# Altium integrated library Weidmueller_OMNIMATE_Signal.IntLib: 2550 symbols (part 19 of 45)
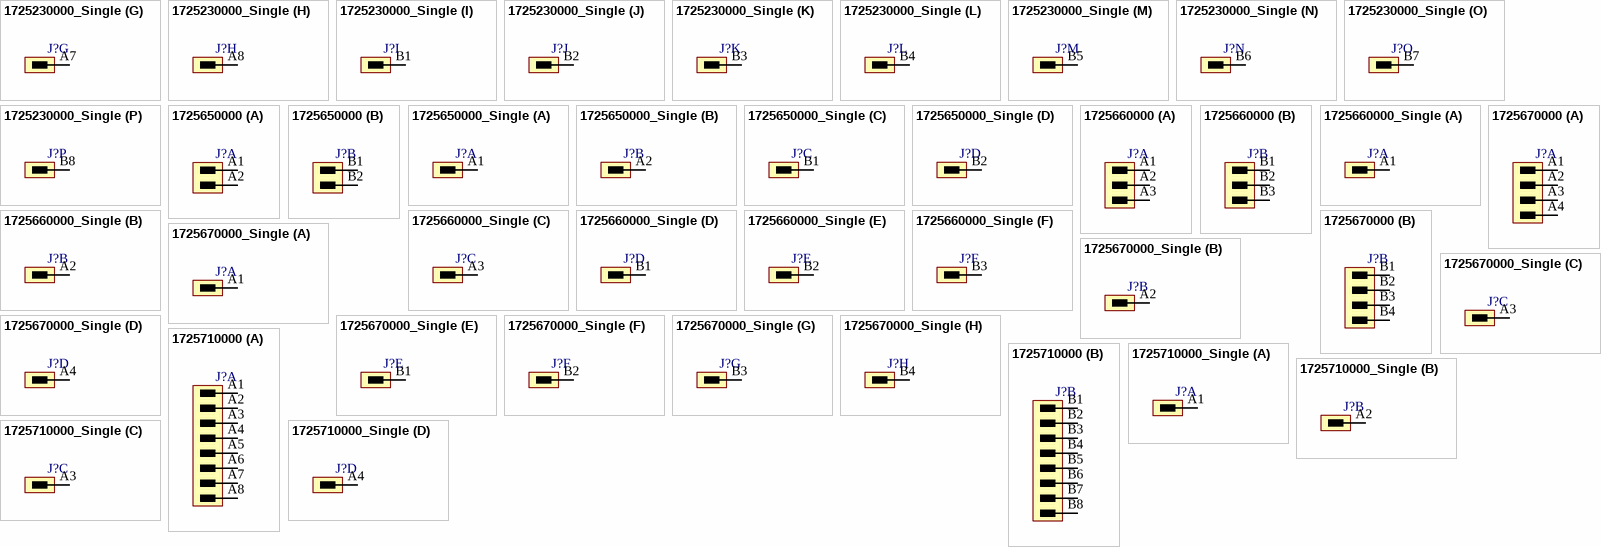
[diagram p229: symbols 1725230000_Single to 1725710000_Single]

## 1725230000_Single
designator J?
OMNIMATE Signal - series BL/SL 5.08; PartNumber: 1725230000; Manufacturer: Weidmueller; Short_text_for_material: SLD 5.08V/16/90 3.2 SN OR BX; Side_termination_characteristic: open side; Mounting_onto_the_PCB: Solder connection; Pitch_mm: 5.08 mm; Pitch_inch: 0.2 inch; No_of_poles: 16; Outgoing_elbow: 90°; Solder_pin_length_mm: 3.2 mm; Contact_material: CuSn; Contact_surface: tinned; Insulating_material: PBT; UL_94_flammability_rating: V-0; Rated_voltage_for_surge_voltage_class_pollution_degree_II_2: 400 V; Rated_voltage_use_group_B_UL_1059: 300 V; Rated_current_use_group_B_UL_1059: 10 A; PackageReference: SLDV_5_08_90_16; Colour: Orange; Packaging: Box; Qty: 20 PCS; Revision: V1; ComponentLink1Description: Manufacturer URL; ComponentLink1URL: http://www.weidmueller.com/; ComponentLink2Description: URL Link1; ComponentLink2URL: http://catalog.weidmueller.com/catalog/Start.do?localeId=en&ObjectID=1725230000
footprint SLDV_5_08_90_16 (OMNIMATE Signal - Serie BL/SL 5.08  SLD 5.08V/16/90 3.2)
part A pins: A1
part B pins: A2
part C pins: A3
part D pins: A4
part E pins: A5
part F pins: A6
part G pins: A7
part H pins: A8
part I pins: B1
part J pins: B2
part K pins: B3
part L pins: B4
part M pins: B5
part N pins: B6
part O pins: B7
part P pins: B8

## 1725650000
designator J?
OMNIMATE Signal - series BL/SL 5.08; PartNumber: 1725650000; Manufacturer: Weidmueller; Short_text_for_material: SLD 5.08V/04/180 3.2SN OR BX; Side_termination_characteristic: open side; Mounting_onto_the_PCB: Solder connection; Pitch_mm: 5.08 mm; Pitch_inch: 0.2 inch; No_of_poles: 4; Outgoing_elbow: 180°; Solder_pin_length_mm: 3.2 mm; Contact_material: CuSn; Contact_surface: tinned; Insulating_material: PBT; UL_94_flammability_rating: V-0; Rated_voltage_for_surge_voltage_class_pollution_degree_II_2: 400 V; Rated_voltage_use_group_B_UL_1059: 300 V; Rated_current_use_group_B_UL_1059: 10 A; PackageReference: SLDV_5_08_180_04; Colour: Orange; Packaging: Box; Qty: 50 PCS; Revision: V1; ComponentLink1Description: Manufacturer URL; ComponentLink1URL: http://www.weidmueller.com/; ComponentLink2Description: URL Link1; ComponentLink2URL: http://catalog.weidmueller.com/catalog/Start.do?localeId=en&ObjectID=1725650000
footprint SLDV_5_08_180_04 (OMNIMATE Signal - Serie BL/SL 5.08  SLD 5.08V/04/180 3.2)
part A pins: A1, A2
part B pins: B1, B2

## 1725650000_Single
designator J?
OMNIMATE Signal - series BL/SL 5.08; PartNumber: 1725650000; Manufacturer: Weidmueller; Short_text_for_material: SLD 5.08V/04/180 3.2SN OR BX; Side_termination_characteristic: open side; Mounting_onto_the_PCB: Solder connection; Pitch_mm: 5.08 mm; Pitch_inch: 0.2 inch; No_of_poles: 4; Outgoing_elbow: 180°; Solder_pin_length_mm: 3.2 mm; Contact_material: CuSn; Contact_surface: tinned; Insulating_material: PBT; UL_94_flammability_rating: V-0; Rated_voltage_for_surge_voltage_class_pollution_degree_II_2: 400 V; Rated_voltage_use_group_B_UL_1059: 300 V; Rated_current_use_group_B_UL_1059: 10 A; PackageReference: SLDV_5_08_180_04; Colour: Orange; Packaging: Box; Qty: 50 PCS; Revision: V1; ComponentLink1Description: Manufacturer URL; ComponentLink1URL: http://www.weidmueller.com/; ComponentLink2Description: URL Link1; ComponentLink2URL: http://catalog.weidmueller.com/catalog/Start.do?localeId=en&ObjectID=1725650000
footprint SLDV_5_08_180_04 (OMNIMATE Signal - Serie BL/SL 5.08  SLD 5.08V/04/180 3.2)
part A pins: A1
part B pins: A2
part C pins: B1
part D pins: B2

## 1725660000
designator J?
OMNIMATE Signal - series BL/SL 5.08; PartNumber: 1725660000; Manufacturer: Weidmueller; Short_text_for_material: SLD 5.08V/06/180 3.2SN OR BX; Side_termination_characteristic: open side; Mounting_onto_the_PCB: Solder connection; Pitch_mm: 5.08 mm; Pitch_inch: 0.2 inch; No_of_poles: 6; Outgoing_elbow: 180°; Solder_pin_length_mm: 3.2 mm; Contact_material: CuSn; Contact_surface: tinned; Insulating_material: PBT; UL_94_flammability_rating: V-0; Rated_voltage_for_surge_voltage_class_pollution_degree_II_2: 400 V; Rated_voltage_use_group_B_UL_1059: 300 V; Rated_current_use_group_B_UL_1059: 10 A; PackageReference: SLDV_5_08_180_06; Colour: Orange; Packaging: Box; Qty: 50 PCS; Revision: V1; ComponentLink1Description: Manufacturer URL; ComponentLink1URL: http://www.weidmueller.com/; ComponentLink2Description: URL Link1; ComponentLink2URL: http://catalog.weidmueller.com/catalog/Start.do?localeId=en&ObjectID=1725660000
footprint SLDV_5_08_180_06 (OMNIMATE Signal - Serie BL/SL 5.08  SLD 5.08V/06/180 3.2)
part A pins: A1, A2, A3
part B pins: B1, B2, B3

## 1725660000_Single
designator J?
OMNIMATE Signal - series BL/SL 5.08; PartNumber: 1725660000; Manufacturer: Weidmueller; Short_text_for_material: SLD 5.08V/06/180 3.2SN OR BX; Side_termination_characteristic: open side; Mounting_onto_the_PCB: Solder connection; Pitch_mm: 5.08 mm; Pitch_inch: 0.2 inch; No_of_poles: 6; Outgoing_elbow: 180°; Solder_pin_length_mm: 3.2 mm; Contact_material: CuSn; Contact_surface: tinned; Insulating_material: PBT; UL_94_flammability_rating: V-0; Rated_voltage_for_surge_voltage_class_pollution_degree_II_2: 400 V; Rated_voltage_use_group_B_UL_1059: 300 V; Rated_current_use_group_B_UL_1059: 10 A; PackageReference: SLDV_5_08_180_06; Colour: Orange; Packaging: Box; Qty: 50 PCS; Revision: V1; ComponentLink1Description: Manufacturer URL; ComponentLink1URL: http://www.weidmueller.com/; ComponentLink2Description: URL Link1; ComponentLink2URL: http://catalog.weidmueller.com/catalog/Start.do?localeId=en&ObjectID=1725660000
footprint SLDV_5_08_180_06 (OMNIMATE Signal - Serie BL/SL 5.08  SLD 5.08V/06/180 3.2)
part A pins: A1
part B pins: A2
part C pins: A3
part D pins: B1
part E pins: B2
part F pins: B3

## 1725670000
designator J?
OMNIMATE Signal - series BL/SL 5.08; PartNumber: 1725670000; Manufacturer: Weidmueller; Short_text_for_material: SLD 5.08V/08/180 3.2SN OR BX; Side_termination_characteristic: open side; Mounting_onto_the_PCB: Solder connection; Pitch_mm: 5.08 mm; Pitch_inch: 0.2 inch; No_of_poles: 8; Outgoing_elbow: 180°; Solder_pin_length_mm: 3.2 mm; Contact_material: CuSn; Contact_surface: tinned; Insulating_material: PBT; UL_94_flammability_rating: V-0; Rated_voltage_for_surge_voltage_class_pollution_degree_II_2: 400 V; Rated_voltage_use_group_B_UL_1059: 300 V; Rated_current_use_group_B_UL_1059: 10 A; PackageReference: SLDV_5_08_180_08; Colour: Orange; Packaging: Box; Qty: 50 PCS; Revision: V1; ComponentLink1Description: Manufacturer URL; ComponentLink1URL: http://www.weidmueller.com/; ComponentLink2Description: URL Link1; ComponentLink2URL: http://catalog.weidmueller.com/catalog/Start.do?localeId=en&ObjectID=1725670000
footprint SLDV_5_08_180_08 (OMNIMATE Signal - Serie BL/SL 5.08  SLD 5.08V/08/180 3.2)
part A pins: A1, A2, A3, A4
part B pins: B1, B2, B3, B4

## 1725670000_Single
designator J?
OMNIMATE Signal - series BL/SL 5.08; PartNumber: 1725670000; Manufacturer: Weidmueller; Short_text_for_material: SLD 5.08V/08/180 3.2SN OR BX; Side_termination_characteristic: open side; Mounting_onto_the_PCB: Solder connection; Pitch_mm: 5.08 mm; Pitch_inch: 0.2 inch; No_of_poles: 8; Outgoing_elbow: 180°; Solder_pin_length_mm: 3.2 mm; Contact_material: CuSn; Contact_surface: tinned; Insulating_material: PBT; UL_94_flammability_rating: V-0; Rated_voltage_for_surge_voltage_class_pollution_degree_II_2: 400 V; Rated_voltage_use_group_B_UL_1059: 300 V; Rated_current_use_group_B_UL_1059: 10 A; PackageReference: SLDV_5_08_180_08; Colour: Orange; Packaging: Box; Qty: 50 PCS; Revision: V1; ComponentLink1Description: Manufacturer URL; ComponentLink1URL: http://www.weidmueller.com/; ComponentLink2Description: URL Link1; ComponentLink2URL: http://catalog.weidmueller.com/catalog/Start.do?localeId=en&ObjectID=1725670000
footprint SLDV_5_08_180_08 (OMNIMATE Signal - Serie BL/SL 5.08  SLD 5.08V/08/180 3.2)
part A pins: A1
part B pins: A2
part C pins: A3
part D pins: A4
part E pins: B1
part F pins: B2
part G pins: B3
part H pins: B4

## 1725710000
designator J?
OMNIMATE Signal - series BL/SL 5.08; PartNumber: 1725710000; Manufacturer: Weidmueller; Short_text_for_material: SLD 5.08V/16/180 3.2SN OR BX; Side_termination_characteristic: open side; Mounting_onto_the_PCB: Solder connection; Pitch_mm: 5.08 mm; Pitch_inch: 0.2 inch; No_of_poles: 16; Outgoing_elbow: 180°; Solder_pin_length_mm: 3.2 mm; Contact_material: CuSn; Contact_surface: tinned; Insulating_material: PBT; UL_94_flammability_rating: V-0; Rated_voltage_for_surge_voltage_class_pollution_degree_II_2: 400 V; Rated_voltage_use_group_B_UL_1059: 300 V; Rated_current_use_group_B_UL_1059: 10 A; PackageReference: SLDV_5_08_180_16; Colour: Orange; Packaging: Box; Qty: 20 PCS; Revision: V1; ComponentLink1Description: Manufacturer URL; ComponentLink1URL: http://www.weidmueller.com/; ComponentLink2Description: URL Link1; ComponentLink2URL: http://catalog.weidmueller.com/catalog/Start.do?localeId=en&ObjectID=1725710000
footprint SLDV_5_08_180_16 (OMNIMATE Signal - Serie BL/SL 5.08  SLD 5.08V/16/180 3.2)
part A pins: A1, A2, A3, A4, A5, A6, A7, A8
part B pins: B1, B2, B3, B4, B5, B6, B7, B8

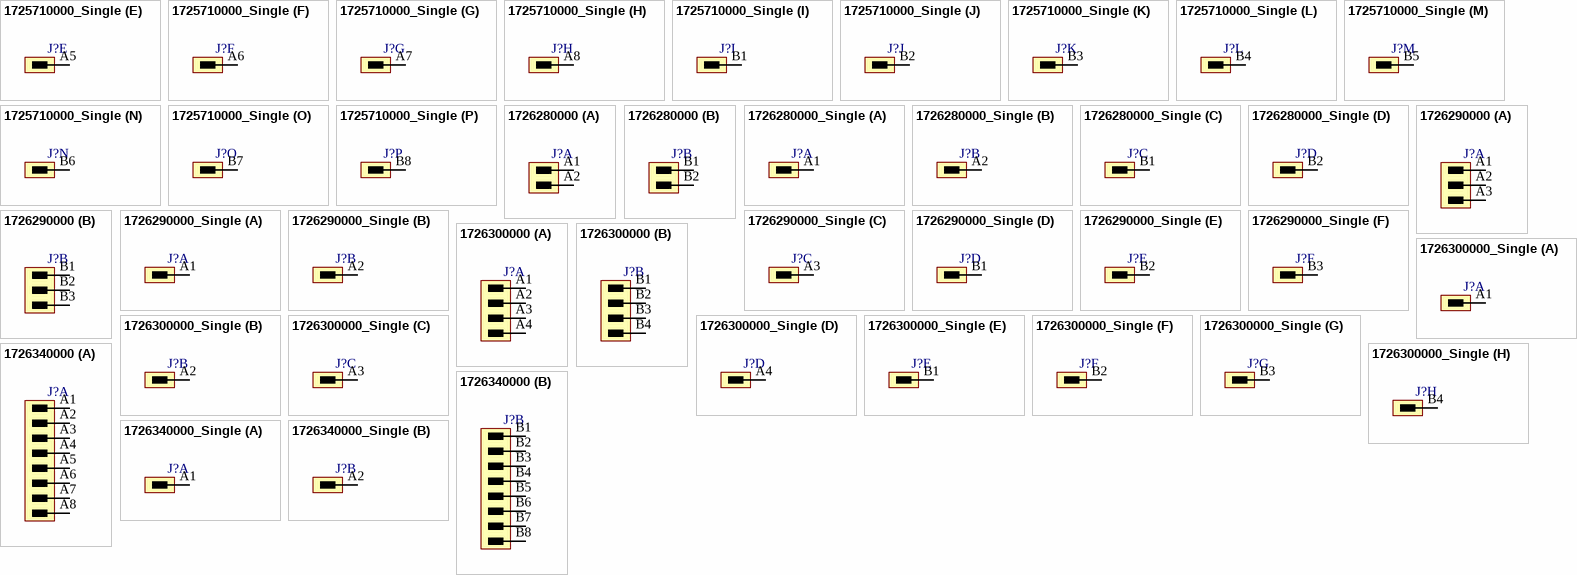
[diagram p102: symbols 1725710000_Single to 1726340000_Single]

## 1725710000_Single
designator J?
OMNIMATE Signal - series BL/SL 5.08; PartNumber: 1725710000; Manufacturer: Weidmueller; Short_text_for_material: SLD 5.08V/16/180 3.2SN OR BX; Side_termination_characteristic: open side; Mounting_onto_the_PCB: Solder connection; Pitch_mm: 5.08 mm; Pitch_inch: 0.2 inch; No_of_poles: 16; Outgoing_elbow: 180°; Solder_pin_length_mm: 3.2 mm; Contact_material: CuSn; Contact_surface: tinned; Insulating_material: PBT; UL_94_flammability_rating: V-0; Rated_voltage_for_surge_voltage_class_pollution_degree_II_2: 400 V; Rated_voltage_use_group_B_UL_1059: 300 V; Rated_current_use_group_B_UL_1059: 10 A; PackageReference: SLDV_5_08_180_16; Colour: Orange; Packaging: Box; Qty: 20 PCS; Revision: V1; ComponentLink1Description: Manufacturer URL; ComponentLink1URL: http://www.weidmueller.com/; ComponentLink2Description: URL Link1; ComponentLink2URL: http://catalog.weidmueller.com/catalog/Start.do?localeId=en&ObjectID=1725710000
footprint SLDV_5_08_180_16 (OMNIMATE Signal - Serie BL/SL 5.08  SLD 5.08V/16/180 3.2)
part A pins: A1
part B pins: A2
part C pins: A3
part D pins: A4
part E pins: A5
part F pins: A6
part G pins: A7
part H pins: A8
part I pins: B1
part J pins: B2
part K pins: B3
part L pins: B4
part M pins: B5
part N pins: B6
part O pins: B7
part P pins: B8

## 1726280000
designator J?
OMNIMATE Signal - series BL/SL 5.08; PartNumber: 1726280000; Manufacturer: Weidmueller; Short_text_for_material: SLD 5.08V/04/90B 3.2 SN OR BX; Side_termination_characteristic: Dovetails for fixing blocks; Mounting_onto_the_PCB: Solder connection; Pitch_mm: 5.08 mm; Pitch_inch: 0.2 inch; No_of_poles: 4; Outgoing_elbow: 90°; Solder_pin_length_mm: 3.2 mm; Contact_material: CuSn; Contact_surface: tinned; Insulating_material: PBT; UL_94_flammability_rating: V-0; Rated_voltage_for_surge_voltage_class_pollution_degree_II_2: 400 V; Rated_voltage_use_group_B_UL_1059: 300 V; Rated_current_use_group_B_UL_1059: 10 A; PackageReference: SLDV_5_08_90B_04; Colour: Orange; Packaging: Box; Qty: 50 PCS; Revision: V1; ComponentLink1Description: Manufacturer URL; ComponentLink1URL: http://www.weidmueller.com/; ComponentLink2Description: URL Link1; ComponentLink2URL: http://catalog.weidmueller.com/catalog/Start.do?localeId=en&ObjectID=1726280000
footprint SLDV_5_08_90B_04 (OMNIMATE Signal - Serie BL/SL 5.08  SLD 5.08V/04/90B 3.2)
part A pins: A1, A2
part B pins: B1, B2

## 1726280000_Single
designator J?
OMNIMATE Signal - series BL/SL 5.08; PartNumber: 1726280000; Manufacturer: Weidmueller; Short_text_for_material: SLD 5.08V/04/90B 3.2 SN OR BX; Side_termination_characteristic: Dovetails for fixing blocks; Mounting_onto_the_PCB: Solder connection; Pitch_mm: 5.08 mm; Pitch_inch: 0.2 inch; No_of_poles: 4; Outgoing_elbow: 90°; Solder_pin_length_mm: 3.2 mm; Contact_material: CuSn; Contact_surface: tinned; Insulating_material: PBT; UL_94_flammability_rating: V-0; Rated_voltage_for_surge_voltage_class_pollution_degree_II_2: 400 V; Rated_voltage_use_group_B_UL_1059: 300 V; Rated_current_use_group_B_UL_1059: 10 A; PackageReference: SLDV_5_08_90B_04; Colour: Orange; Packaging: Box; Qty: 50 PCS; Revision: V1; ComponentLink1Description: Manufacturer URL; ComponentLink1URL: http://www.weidmueller.com/; ComponentLink2Description: URL Link1; ComponentLink2URL: http://catalog.weidmueller.com/catalog/Start.do?localeId=en&ObjectID=1726280000
footprint SLDV_5_08_90B_04 (OMNIMATE Signal - Serie BL/SL 5.08  SLD 5.08V/04/90B 3.2)
part A pins: A1
part B pins: A2
part C pins: B1
part D pins: B2

## 1726290000
designator J?
OMNIMATE Signal - series BL/SL 5.08; PartNumber: 1726290000; Manufacturer: Weidmueller; Short_text_for_material: SLD 5.08V/06/90B 3.2 SN OR BX; Side_termination_characteristic: Dovetails for fixing blocks; Mounting_onto_the_PCB: Solder connection; Pitch_mm: 5.08 mm; Pitch_inch: 0.2 inch; No_of_poles: 6; Outgoing_elbow: 90°; Solder_pin_length_mm: 3.2 mm; Contact_material: CuSn; Contact_surface: tinned; Insulating_material: PBT; UL_94_flammability_rating: V-0; Rated_voltage_for_surge_voltage_class_pollution_degree_II_2: 400 V; Rated_voltage_use_group_B_UL_1059: 300 V; Rated_current_use_group_B_UL_1059: 10 A; PackageReference: SLDV_5_08_90B_06; Colour: Orange; Packaging: Box; Qty: 50 PCS; Revision: V1; ComponentLink1Description: Manufacturer URL; ComponentLink1URL: http://www.weidmueller.com/; ComponentLink2Description: URL Link1; ComponentLink2URL: http://catalog.weidmueller.com/catalog/Start.do?localeId=en&ObjectID=1726290000
footprint SLDV_5_08_90B_06 (OMNIMATE Signal - Serie BL/SL 5.08  SLD 5.08V/06/90B 3.2)
part A pins: A1, A2, A3
part B pins: B1, B2, B3

## 1726290000_Single
designator J?
OMNIMATE Signal - series BL/SL 5.08; PartNumber: 1726290000; Manufacturer: Weidmueller; Short_text_for_material: SLD 5.08V/06/90B 3.2 SN OR BX; Side_termination_characteristic: Dovetails for fixing blocks; Mounting_onto_the_PCB: Solder connection; Pitch_mm: 5.08 mm; Pitch_inch: 0.2 inch; No_of_poles: 6; Outgoing_elbow: 90°; Solder_pin_length_mm: 3.2 mm; Contact_material: CuSn; Contact_surface: tinned; Insulating_material: PBT; UL_94_flammability_rating: V-0; Rated_voltage_for_surge_voltage_class_pollution_degree_II_2: 400 V; Rated_voltage_use_group_B_UL_1059: 300 V; Rated_current_use_group_B_UL_1059: 10 A; PackageReference: SLDV_5_08_90B_06; Colour: Orange; Packaging: Box; Qty: 50 PCS; Revision: V1; ComponentLink1Description: Manufacturer URL; ComponentLink1URL: http://www.weidmueller.com/; ComponentLink2Description: URL Link1; ComponentLink2URL: http://catalog.weidmueller.com/catalog/Start.do?localeId=en&ObjectID=1726290000
footprint SLDV_5_08_90B_06 (OMNIMATE Signal - Serie BL/SL 5.08  SLD 5.08V/06/90B 3.2)
part A pins: A1
part B pins: A2
part C pins: A3
part D pins: B1
part E pins: B2
part F pins: B3

## 1726300000
designator J?
OMNIMATE Signal - series BL/SL 5.08; PartNumber: 1726300000; Manufacturer: Weidmueller; Short_text_for_material: SLD 5.08V/08/90B 3.2 SN OR BX; Side_termination_characteristic: Dovetails for fixing blocks; Mounting_onto_the_PCB: Solder connection; Pitch_mm: 5.08 mm; Pitch_inch: 0.2 inch; No_of_poles: 8; Outgoing_elbow: 90°; Solder_pin_length_mm: 3.2 mm; Contact_material: CuSn; Contact_surface: tinned; Insulating_material: PBT; UL_94_flammability_rating: V-0; Rated_voltage_for_surge_voltage_class_pollution_degree_II_2: 400 V; Rated_voltage_use_group_B_UL_1059: 300 V; Rated_current_use_group_B_UL_1059: 10 A; PackageReference: SLDV_5_08_90B_08; Colour: Orange; Packaging: Box; Qty: 50 PCS; Revision: V1; ComponentLink1Description: Manufacturer URL; ComponentLink1URL: http://www.weidmueller.com/; ComponentLink2Description: URL Link1; ComponentLink2URL: http://catalog.weidmueller.com/catalog/Start.do?localeId=en&ObjectID=1726300000
footprint SLDV_5_08_90B_08 (OMNIMATE Signal - Serie BL/SL 5.08  SLD 5.08V/08/90B 3.2)
part A pins: A1, A2, A3, A4
part B pins: B1, B2, B3, B4

## 1726300000_Single
designator J?
OMNIMATE Signal - series BL/SL 5.08; PartNumber: 1726300000; Manufacturer: Weidmueller; Short_text_for_material: SLD 5.08V/08/90B 3.2 SN OR BX; Side_termination_characteristic: Dovetails for fixing blocks; Mounting_onto_the_PCB: Solder connection; Pitch_mm: 5.08 mm; Pitch_inch: 0.2 inch; No_of_poles: 8; Outgoing_elbow: 90°; Solder_pin_length_mm: 3.2 mm; Contact_material: CuSn; Contact_surface: tinned; Insulating_material: PBT; UL_94_flammability_rating: V-0; Rated_voltage_for_surge_voltage_class_pollution_degree_II_2: 400 V; Rated_voltage_use_group_B_UL_1059: 300 V; Rated_current_use_group_B_UL_1059: 10 A; PackageReference: SLDV_5_08_90B_08; Colour: Orange; Packaging: Box; Qty: 50 PCS; Revision: V1; ComponentLink1Description: Manufacturer URL; ComponentLink1URL: http://www.weidmueller.com/; ComponentLink2Description: URL Link1; ComponentLink2URL: http://catalog.weidmueller.com/catalog/Start.do?localeId=en&ObjectID=1726300000
footprint SLDV_5_08_90B_08 (OMNIMATE Signal - Serie BL/SL 5.08  SLD 5.08V/08/90B 3.2)
part A pins: A1
part B pins: A2
part C pins: A3
part D pins: A4
part E pins: B1
part F pins: B2
part G pins: B3
part H pins: B4

## 1726340000
designator J?
OMNIMATE Signal - series BL/SL 5.08; PartNumber: 1726340000; Manufacturer: Weidmueller; Short_text_for_material: SLD 5.08V/16/90B 3.2 SN OR BX; Side_termination_characteristic: Dovetails for fixing blocks; Mounting_onto_the_PCB: Solder connection; Pitch_mm: 5.08 mm; Pitch_inch: 0.2 inch; No_of_poles: 16; Outgoing_elbow: 90°; Solder_pin_length_mm: 3.2 mm; Contact_material: CuSn; Contact_surface: tinned; Insulating_material: PBT; UL_94_flammability_rating: V-0; Rated_voltage_for_surge_voltage_class_pollution_degree_II_2: 400 V; Rated_voltage_use_group_B_UL_1059: 300 V; Rated_current_use_group_B_UL_1059: 10 A; PackageReference: SLDV_5_08_90B_16; Colour: Orange; Packaging: Box; Qty: 20 PCS; Revision: V1; ComponentLink1Description: Manufacturer URL; ComponentLink1URL: http://www.weidmueller.com/; ComponentLink2Description: URL Link1; ComponentLink2URL: http://catalog.weidmueller.com/catalog/Start.do?localeId=en&ObjectID=1726340000
footprint SLDV_5_08_90B_16 (OMNIMATE Signal - Serie BL/SL 5.08  SLD 5.08V/16/90B 3.2)
part A pins: A1, A2, A3, A4, A5, A6, A7, A8
part B pins: B1, B2, B3, B4, B5, B6, B7, B8

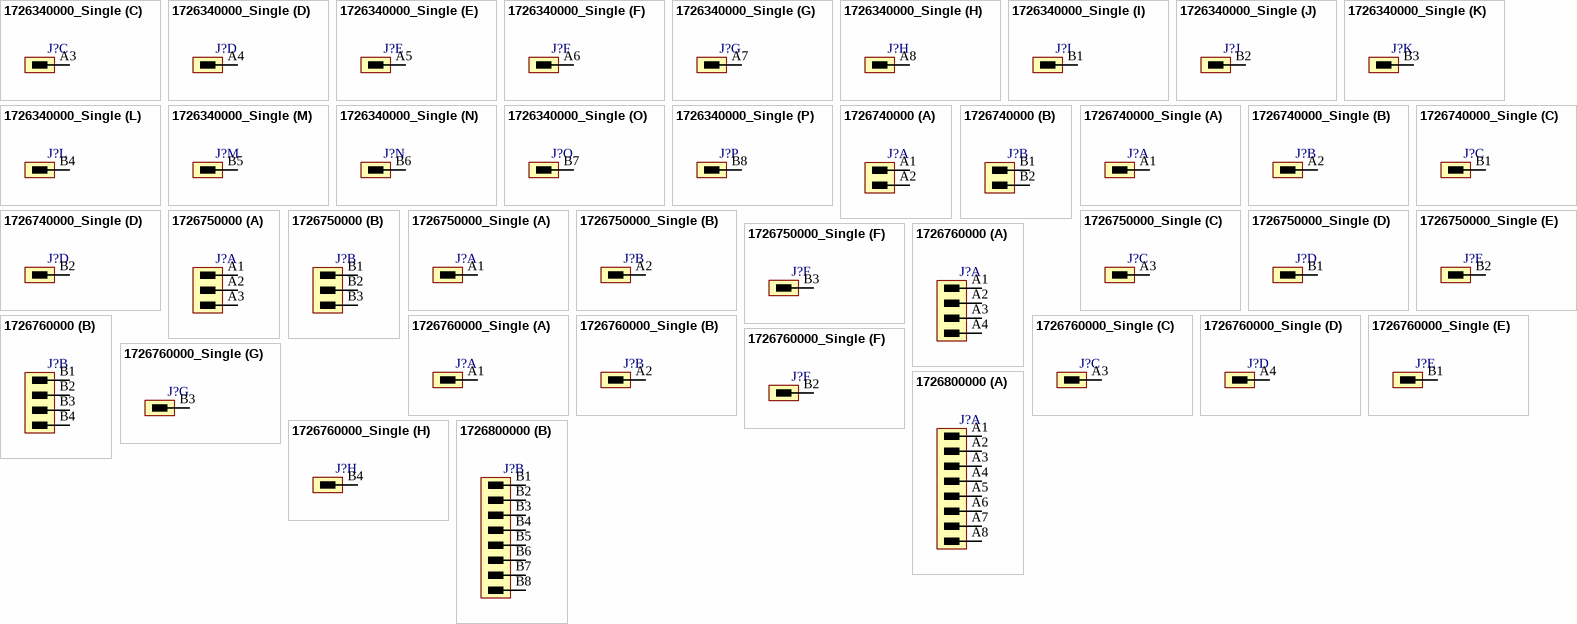
[diagram p103: symbols 1726340000_Single to 1726800000]

## 1726340000_Single
designator J?
OMNIMATE Signal - series BL/SL 5.08; PartNumber: 1726340000; Manufacturer: Weidmueller; Short_text_for_material: SLD 5.08V/16/90B 3.2 SN OR BX; Side_termination_characteristic: Dovetails for fixing blocks; Mounting_onto_the_PCB: Solder connection; Pitch_mm: 5.08 mm; Pitch_inch: 0.2 inch; No_of_poles: 16; Outgoing_elbow: 90°; Solder_pin_length_mm: 3.2 mm; Contact_material: CuSn; Contact_surface: tinned; Insulating_material: PBT; UL_94_flammability_rating: V-0; Rated_voltage_for_surge_voltage_class_pollution_degree_II_2: 400 V; Rated_voltage_use_group_B_UL_1059: 300 V; Rated_current_use_group_B_UL_1059: 10 A; PackageReference: SLDV_5_08_90B_16; Colour: Orange; Packaging: Box; Qty: 20 PCS; Revision: V1; ComponentLink1Description: Manufacturer URL; ComponentLink1URL: http://www.weidmueller.com/; ComponentLink2Description: URL Link1; ComponentLink2URL: http://catalog.weidmueller.com/catalog/Start.do?localeId=en&ObjectID=1726340000
footprint SLDV_5_08_90B_16 (OMNIMATE Signal - Serie BL/SL 5.08  SLD 5.08V/16/90B 3.2)
part A pins: A1
part B pins: A2
part C pins: A3
part D pins: A4
part E pins: A5
part F pins: A6
part G pins: A7
part H pins: A8
part I pins: B1
part J pins: B2
part K pins: B3
part L pins: B4
part M pins: B5
part N pins: B6
part O pins: B7
part P pins: B8

## 1726740000
designator J?
OMNIMATE Signal - series BL/SL 5.08; PartNumber: 1726740000; Manufacturer: Weidmueller; Short_text_for_material: SLD 5.08V/04/180B 3.2SN OR BX; Side_termination_characteristic: Dovetails for fixing blocks; Mounting_onto_the_PCB: Solder connection; Pitch_mm: 5.08 mm; Pitch_inch: 0.2 inch; No_of_poles: 4; Outgoing_elbow: 180°; Solder_pin_length_mm: 3.2 mm; Contact_material: CuSn; Contact_surface: tinned; Insulating_material: PBT; UL_94_flammability_rating: V-0; Rated_voltage_for_surge_voltage_class_pollution_degree_II_2: 400 V; Rated_voltage_use_group_B_UL_1059: 300 V; Rated_current_use_group_B_UL_1059: 10 A; PackageReference: SLDV_5_08_180B_04; Colour: Orange; Packaging: Box; Qty: 50 PCS; Revision: V1; ComponentLink1Description: Manufacturer URL; ComponentLink1URL: http://www.weidmueller.com/; ComponentLink2Description: URL Link1; ComponentLink2URL: http://catalog.weidmueller.com/catalog/Start.do?localeId=en&ObjectID=1726740000
footprint SLDV_5_08_180B_04 (OMNIMATE Signal - Serie BL/SL 5.08  SLD 5.08V/04/180 3.2)
part A pins: A1, A2
part B pins: B1, B2

## 1726740000_Single
designator J?
OMNIMATE Signal - series BL/SL 5.08; PartNumber: 1726740000; Manufacturer: Weidmueller; Short_text_for_material: SLD 5.08V/04/180B 3.2SN OR BX; Side_termination_characteristic: Dovetails for fixing blocks; Mounting_onto_the_PCB: Solder connection; Pitch_mm: 5.08 mm; Pitch_inch: 0.2 inch; No_of_poles: 4; Outgoing_elbow: 180°; Solder_pin_length_mm: 3.2 mm; Contact_material: CuSn; Contact_surface: tinned; Insulating_material: PBT; UL_94_flammability_rating: V-0; Rated_voltage_for_surge_voltage_class_pollution_degree_II_2: 400 V; Rated_voltage_use_group_B_UL_1059: 300 V; Rated_current_use_group_B_UL_1059: 10 A; PackageReference: SLDV_5_08_180B_04; Colour: Orange; Packaging: Box; Qty: 50 PCS; Revision: V1; ComponentLink1Description: Manufacturer URL; ComponentLink1URL: http://www.weidmueller.com/; ComponentLink2Description: URL Link1; ComponentLink2URL: http://catalog.weidmueller.com/catalog/Start.do?localeId=en&ObjectID=1726740000
footprint SLDV_5_08_180B_04 (OMNIMATE Signal - Serie BL/SL 5.08  SLD 5.08V/04/180 3.2)
part A pins: A1
part B pins: A2
part C pins: B1
part D pins: B2

## 1726750000
designator J?
OMNIMATE Signal - series BL/SL 5.08; PartNumber: 1726750000; Manufacturer: Weidmueller; Short_text_for_material: SLD 5.08V/06/180B 3.2SN OR BX; Side_termination_characteristic: Dovetails for fixing blocks; Mounting_onto_the_PCB: Solder connection; Pitch_mm: 5.08 mm; Pitch_inch: 0.2 inch; No_of_poles: 6; Outgoing_elbow: 180°; Solder_pin_length_mm: 3.2 mm; Contact_material: CuSn; Contact_surface: tinned; Insulating_material: PBT; UL_94_flammability_rating: V-0; Rated_voltage_for_surge_voltage_class_pollution_degree_II_2: 400 V; Rated_voltage_use_group_B_UL_1059: 300 V; Rated_current_use_group_B_UL_1059: 10 A; PackageReference: SLDV_5_08_180B_06; Colour: Orange; Packaging: Box; Qty: 50 PCS; Revision: V1; ComponentLink1Description: Manufacturer URL; ComponentLink1URL: http://www.weidmueller.com/; ComponentLink2Description: URL Link1; ComponentLink2URL: http://catalog.weidmueller.com/catalog/Start.do?localeId=en&ObjectID=1726750000
footprint SLDV_5_08_180B_06 (OMNIMATE Signal - Serie BL/SL 5.08  SLD 5.08V/06/180 3.2)
part A pins: A1, A2, A3
part B pins: B1, B2, B3

## 1726750000_Single
designator J?
OMNIMATE Signal - series BL/SL 5.08; PartNumber: 1726750000; Manufacturer: Weidmueller; Short_text_for_material: SLD 5.08V/06/180B 3.2SN OR BX; Side_termination_characteristic: Dovetails for fixing blocks; Mounting_onto_the_PCB: Solder connection; Pitch_mm: 5.08 mm; Pitch_inch: 0.2 inch; No_of_poles: 6; Outgoing_elbow: 180°; Solder_pin_length_mm: 3.2 mm; Contact_material: CuSn; Contact_surface: tinned; Insulating_material: PBT; UL_94_flammability_rating: V-0; Rated_voltage_for_surge_voltage_class_pollution_degree_II_2: 400 V; Rated_voltage_use_group_B_UL_1059: 300 V; Rated_current_use_group_B_UL_1059: 10 A; PackageReference: SLDV_5_08_180B_06; Colour: Orange; Packaging: Box; Qty: 50 PCS; Revision: V1; ComponentLink1Description: Manufacturer URL; ComponentLink1URL: http://www.weidmueller.com/; ComponentLink2Description: URL Link1; ComponentLink2URL: http://catalog.weidmueller.com/catalog/Start.do?localeId=en&ObjectID=1726750000
footprint SLDV_5_08_180B_06 (OMNIMATE Signal - Serie BL/SL 5.08  SLD 5.08V/06/180 3.2)
part A pins: A1
part B pins: A2
part C pins: A3
part D pins: B1
part E pins: B2
part F pins: B3

## 1726760000
designator J?
OMNIMATE Signal - series BL/SL 5.08; PartNumber: 1726760000; Manufacturer: Weidmueller; Short_text_for_material: SLD 5.08V/08/180B 3.2SN OR BX; Side_termination_characteristic: Dovetails for fixing blocks; Mounting_onto_the_PCB: Solder connection; Pitch_mm: 5.08 mm; Pitch_inch: 0.2 inch; No_of_poles: 8; Outgoing_elbow: 180°; Solder_pin_length_mm: 3.2 mm; Contact_material: CuSn; Contact_surface: tinned; Insulating_material: PBT; UL_94_flammability_rating: V-0; Rated_voltage_for_surge_voltage_class_pollution_degree_II_2: 400 V; Rated_voltage_use_group_B_UL_1059: 300 V; Rated_current_use_group_B_UL_1059: 10 A; PackageReference: SLDV_5_08_180B_08; Colour: Orange; Packaging: Box; Qty: 50 PCS; Revision: V1; ComponentLink1Description: Manufacturer URL; ComponentLink1URL: http://www.weidmueller.com/; ComponentLink2Description: URL Link1; ComponentLink2URL: http://catalog.weidmueller.com/catalog/Start.do?localeId=en&ObjectID=1726760000
footprint SLDV_5_08_180B_08 (OMNIMATE Signal - Serie BL/SL 5.08  SLD 5.08V/08/180 3.2)
part A pins: A1, A2, A3, A4
part B pins: B1, B2, B3, B4

## 1726760000_Single
designator J?
OMNIMATE Signal - series BL/SL 5.08; PartNumber: 1726760000; Manufacturer: Weidmueller; Short_text_for_material: SLD 5.08V/08/180B 3.2SN OR BX; Side_termination_characteristic: Dovetails for fixing blocks; Mounting_onto_the_PCB: Solder connection; Pitch_mm: 5.08 mm; Pitch_inch: 0.2 inch; No_of_poles: 8; Outgoing_elbow: 180°; Solder_pin_length_mm: 3.2 mm; Contact_material: CuSn; Contact_surface: tinned; Insulating_material: PBT; UL_94_flammability_rating: V-0; Rated_voltage_for_surge_voltage_class_pollution_degree_II_2: 400 V; Rated_voltage_use_group_B_UL_1059: 300 V; Rated_current_use_group_B_UL_1059: 10 A; PackageReference: SLDV_5_08_180B_08; Colour: Orange; Packaging: Box; Qty: 50 PCS; Revision: V1; ComponentLink1Description: Manufacturer URL; ComponentLink1URL: http://www.weidmueller.com/; ComponentLink2Description: URL Link1; ComponentLink2URL: http://catalog.weidmueller.com/catalog/Start.do?localeId=en&ObjectID=1726760000
footprint SLDV_5_08_180B_08 (OMNIMATE Signal - Serie BL/SL 5.08  SLD 5.08V/08/180 3.2)
part A pins: A1
part B pins: A2
part C pins: A3
part D pins: A4
part E pins: B1
part F pins: B2
part G pins: B3
part H pins: B4

## 1726800000
designator J?
OMNIMATE Signal - series BL/SL 5.08; PartNumber: 1726800000; Manufacturer: Weidmueller; Short_text_for_material: SLD 5.08V/16/180B 3.2SN OR BX; Side_termination_characteristic: Dovetails for fixing blocks; Mounting_onto_the_PCB: Solder connection; Pitch_mm: 5.08 mm; Pitch_inch: 0.2 inch; No_of_poles: 16; Outgoing_elbow: 180°; Solder_pin_length_mm: 3.2 mm; Contact_material: CuSn; Contact_surface: tinned; Insulating_material: PBT; UL_94_flammability_rating: V-0; Rated_voltage_for_surge_voltage_class_pollution_degree_II_2: 400 V; Rated_voltage_use_group_B_UL_1059: 300 V; Rated_current_use_group_B_UL_1059: 10 A; PackageReference: SLDV_5_08_180B_16; Colour: Orange; Packaging: Box; Qty: 20 PCS; Revision: V1; ComponentLink1Description: Manufacturer URL; ComponentLink1URL: http://www.weidmueller.com/; ComponentLink2Description: URL Link1; ComponentLink2URL: http://catalog.weidmueller.com/catalog/Start.do?localeId=en&ObjectID=1726800000
footprint SLDV_5_08_180B_16 (OMNIMATE Signal - Serie BL/SL 5.08  SLD 5.08V/16/180 3.2)
part A pins: A1, A2, A3, A4, A5, A6, A7, A8
part B pins: B1, B2, B3, B4, B5, B6, B7, B8

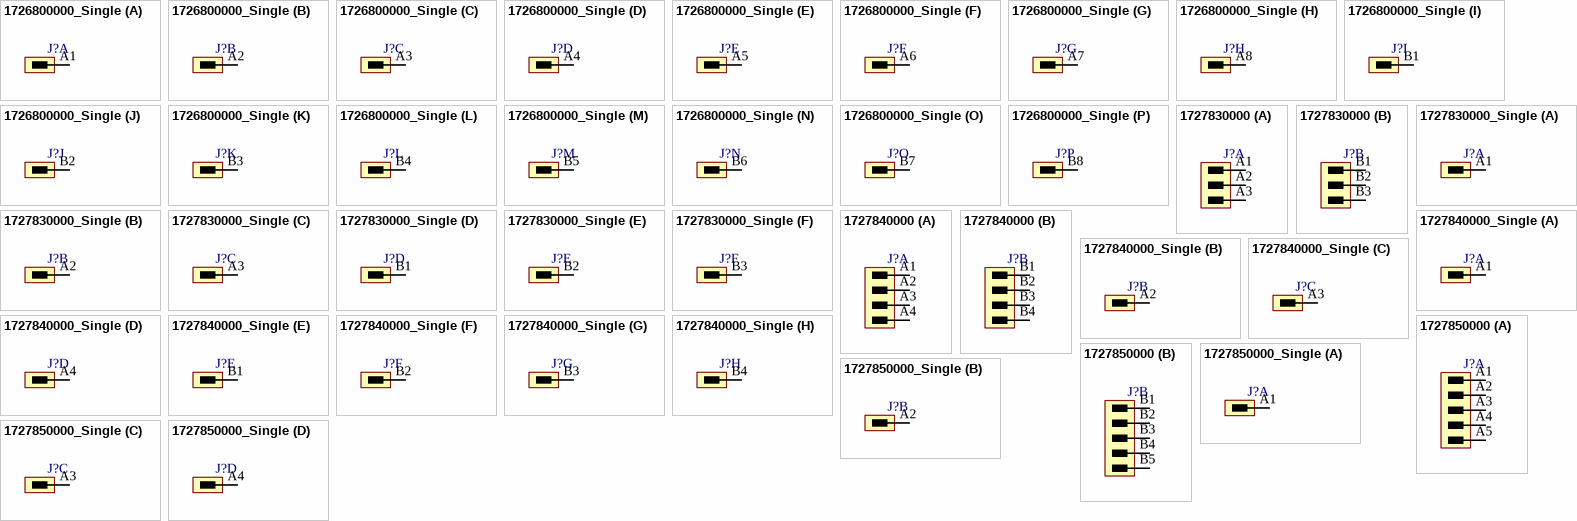
[diagram p104: symbols 1726800000_Single to 1727850000_Single]

## 1726800000_Single
designator J?
OMNIMATE Signal - series BL/SL 5.08; PartNumber: 1726800000; Manufacturer: Weidmueller; Short_text_for_material: SLD 5.08V/16/180B 3.2SN OR BX; Side_termination_characteristic: Dovetails for fixing blocks; Mounting_onto_the_PCB: Solder connection; Pitch_mm: 5.08 mm; Pitch_inch: 0.2 inch; No_of_poles: 16; Outgoing_elbow: 180°; Solder_pin_length_mm: 3.2 mm; Contact_material: CuSn; Contact_surface: tinned; Insulating_material: PBT; UL_94_flammability_rating: V-0; Rated_voltage_for_surge_voltage_class_pollution_degree_II_2: 400 V; Rated_voltage_use_group_B_UL_1059: 300 V; Rated_current_use_group_B_UL_1059: 10 A; PackageReference: SLDV_5_08_180B_16; Colour: Orange; Packaging: Box; Qty: 20 PCS; Revision: V1; ComponentLink1Description: Manufacturer URL; ComponentLink1URL: http://www.weidmueller.com/; ComponentLink2Description: URL Link1; ComponentLink2URL: http://catalog.weidmueller.com/catalog/Start.do?localeId=en&ObjectID=1726800000
footprint SLDV_5_08_180B_16 (OMNIMATE Signal - Serie BL/SL 5.08  SLD 5.08V/16/180 3.2)
part A pins: A1
part B pins: A2
part C pins: A3
part D pins: A4
part E pins: A5
part F pins: A6
part G pins: A7
part H pins: A8
part I pins: B1
part J pins: B2
part K pins: B3
part L pins: B4
part M pins: B5
part N pins: B6
part O pins: B7
part P pins: B8

## 1727830000
designator J?
OMNIMATE Signal - series B2L/S2L 3.50 - 2-row; PartNumber: 1727830000; Manufacturer: Weidmueller; Short_text_for_material: S2L 3.50/06/90G 3.5SN OR BX; Side_termination_characteristic: closed side; Mounting_onto_the_PCB: Solder connection; Pitch_mm: 3.5 mm; Pitch_inch: 0.138 inch; No_of_poles: 6; Outgoing_elbow: 90°; Contact_material: Cu-Leg; Contact_surface: tinned; Insulating_material: PBT; UL_94_flammability_rating: V-0; Rated_voltage_for_surge_voltage_class_pollution_degree_II_2: 250 V; Rated_voltage_use_group_B_UL_1059: 150 V; Rated_current_use_group_B_UL_1059: 10 A; PackageReference: S2L_3_50_90G_06; Colour: Orange; Solder_pin_length_mm: 3.5 mm; Packaging: Box; Qty: 50 PCS; Revision: V1; ComponentLink1Description: Manufacturer URL; ComponentLink1URL: http://www.weidmueller.com/; ComponentLink2Description: URL Link1; ComponentLink2URL: http://catalog.weidmueller.com/catalog/Start.do?localeId=en&ObjectID=1727830000
footprint S2L_3_50_90G_06 (OMNIMATE Signal - Serie B2L/S2L 3.50 - 2-reihig  S2L 3.50/06/90G 3.5)
part A pins: A1, A2, A3
part B pins: B1, B2, B3

## 1727830000_Single
designator J?
OMNIMATE Signal - series B2L/S2L 3.50 - 2-row; PartNumber: 1727830000; Manufacturer: Weidmueller; Short_text_for_material: S2L 3.50/06/90G 3.5SN OR BX; Side_termination_characteristic: closed side; Mounting_onto_the_PCB: Solder connection; Pitch_mm: 3.5 mm; Pitch_inch: 0.138 inch; No_of_poles: 6; Outgoing_elbow: 90°; Contact_material: Cu-Leg; Contact_surface: tinned; Insulating_material: PBT; UL_94_flammability_rating: V-0; Rated_voltage_for_surge_voltage_class_pollution_degree_II_2: 250 V; Rated_voltage_use_group_B_UL_1059: 150 V; Rated_current_use_group_B_UL_1059: 10 A; PackageReference: S2L_3_50_90G_06; Colour: Orange; Solder_pin_length_mm: 3.5 mm; Packaging: Box; Qty: 50 PCS; Revision: V1; ComponentLink1Description: Manufacturer URL; ComponentLink1URL: http://www.weidmueller.com/; ComponentLink2Description: URL Link1; ComponentLink2URL: http://catalog.weidmueller.com/catalog/Start.do?localeId=en&ObjectID=1727830000
footprint S2L_3_50_90G_06 (OMNIMATE Signal - Serie B2L/S2L 3.50 - 2-reihig  S2L 3.50/06/90G 3.5)
part A pins: A1
part B pins: A2
part C pins: A3
part D pins: B1
part E pins: B2
part F pins: B3

## 1727840000
designator J?
OMNIMATE Signal - series B2L/S2L 3.50 - 2-row; PartNumber: 1727840000; Manufacturer: Weidmueller; Short_text_for_material: S2L 3.50/08/90G 3.5SN OR BX; Side_termination_characteristic: closed side; Mounting_onto_the_PCB: Solder connection; Pitch_mm: 3.5 mm; Pitch_inch: 0.138 inch; No_of_poles: 8; Outgoing_elbow: 90°; Contact_material: Cu-Leg; Contact_surface: tinned; Insulating_material: PBT; UL_94_flammability_rating: V-0; Rated_voltage_for_surge_voltage_class_pollution_degree_II_2: 250 V; Rated_voltage_use_group_B_UL_1059: 150 V; Rated_current_use_group_B_UL_1059: 10 A; PackageReference: S2L_3_50_90G_08; Colour: Orange; Solder_pin_length_mm: 3.5 mm; Packaging: Box; Qty: 50 PCS; Revision: V1; ComponentLink1Description: Manufacturer URL; ComponentLink1URL: http://www.weidmueller.com/; ComponentLink2Description: URL Link1; ComponentLink2URL: http://catalog.weidmueller.com/catalog/Start.do?localeId=en&ObjectID=1727840000
footprint S2L_3_50_90G_08 (OMNIMATE Signal - Serie B2L/S2L 3.50 - 2-reihig  S2L 3.50/08/90G 3.5)
part A pins: A1, A2, A3, A4
part B pins: B1, B2, B3, B4

## 1727840000_Single
designator J?
OMNIMATE Signal - series B2L/S2L 3.50 - 2-row; PartNumber: 1727840000; Manufacturer: Weidmueller; Short_text_for_material: S2L 3.50/08/90G 3.5SN OR BX; Side_termination_characteristic: closed side; Mounting_onto_the_PCB: Solder connection; Pitch_mm: 3.5 mm; Pitch_inch: 0.138 inch; No_of_poles: 8; Outgoing_elbow: 90°; Contact_material: Cu-Leg; Contact_surface: tinned; Insulating_material: PBT; UL_94_flammability_rating: V-0; Rated_voltage_for_surge_voltage_class_pollution_degree_II_2: 250 V; Rated_voltage_use_group_B_UL_1059: 150 V; Rated_current_use_group_B_UL_1059: 10 A; PackageReference: S2L_3_50_90G_08; Colour: Orange; Solder_pin_length_mm: 3.5 mm; Packaging: Box; Qty: 50 PCS; Revision: V1; ComponentLink1Description: Manufacturer URL; ComponentLink1URL: http://www.weidmueller.com/; ComponentLink2Description: URL Link1; ComponentLink2URL: http://catalog.weidmueller.com/catalog/Start.do?localeId=en&ObjectID=1727840000
footprint S2L_3_50_90G_08 (OMNIMATE Signal - Serie B2L/S2L 3.50 - 2-reihig  S2L 3.50/08/90G 3.5)
part A pins: A1
part B pins: A2
part C pins: A3
part D pins: A4
part E pins: B1
part F pins: B2
part G pins: B3
part H pins: B4

## 1727850000
designator J?
OMNIMATE Signal - series B2L/S2L 3.50 - 2-row; PartNumber: 1727850000; Manufacturer: Weidmueller; Short_text_for_material: S2L 3.50/10/90G 3.5SN OR BX; Side_termination_characteristic: closed side; Mounting_onto_the_PCB: Solder connection; Pitch_mm: 3.5 mm; Pitch_inch: 0.138 inch; No_of_poles: 10; Outgoing_elbow: 90°; Contact_material: Cu-Leg; Contact_surface: tinned; Insulating_material: PBT; UL_94_flammability_rating: V-0; Rated_voltage_for_surge_voltage_class_pollution_degree_II_2: 250 V; Rated_voltage_use_group_B_UL_1059: 150 V; Rated_current_use_group_B_UL_1059: 10 A; PackageReference: S2L_3_50_90G_10; Colour: Orange; Solder_pin_length_mm: 3.5 mm; Packaging: Box; Qty: 50 PCS; Revision: V1; ComponentLink1Description: Manufacturer URL; ComponentLink1URL: http://www.weidmueller.com/; ComponentLink2Description: URL Link1; ComponentLink2URL: http://catalog.weidmueller.com/catalog/Start.do?localeId=en&ObjectID=1727850000
footprint S2L_3_50_90G_10 (OMNIMATE Signal - Serie B2L/S2L 3.50 - 2-reihig  S2L 3.50/10/90G 3.5)
part A pins: A1, A2, A3, A4, A5
part B pins: B1, B2, B3, B4, B5
